# Altium footprint library Res.PcbLib: 49 footprints (part 1 of 4)
Each footprint in its own frame and in the unit in brackets; x right, y up, seen from the top. Pads: shape width x height; smd on the part's side, far side on the other; paste and mask are expansions set on the pad; w line width, h text height; cw(c..) or ccw(c..) is an arc to the next point about the centre after c.
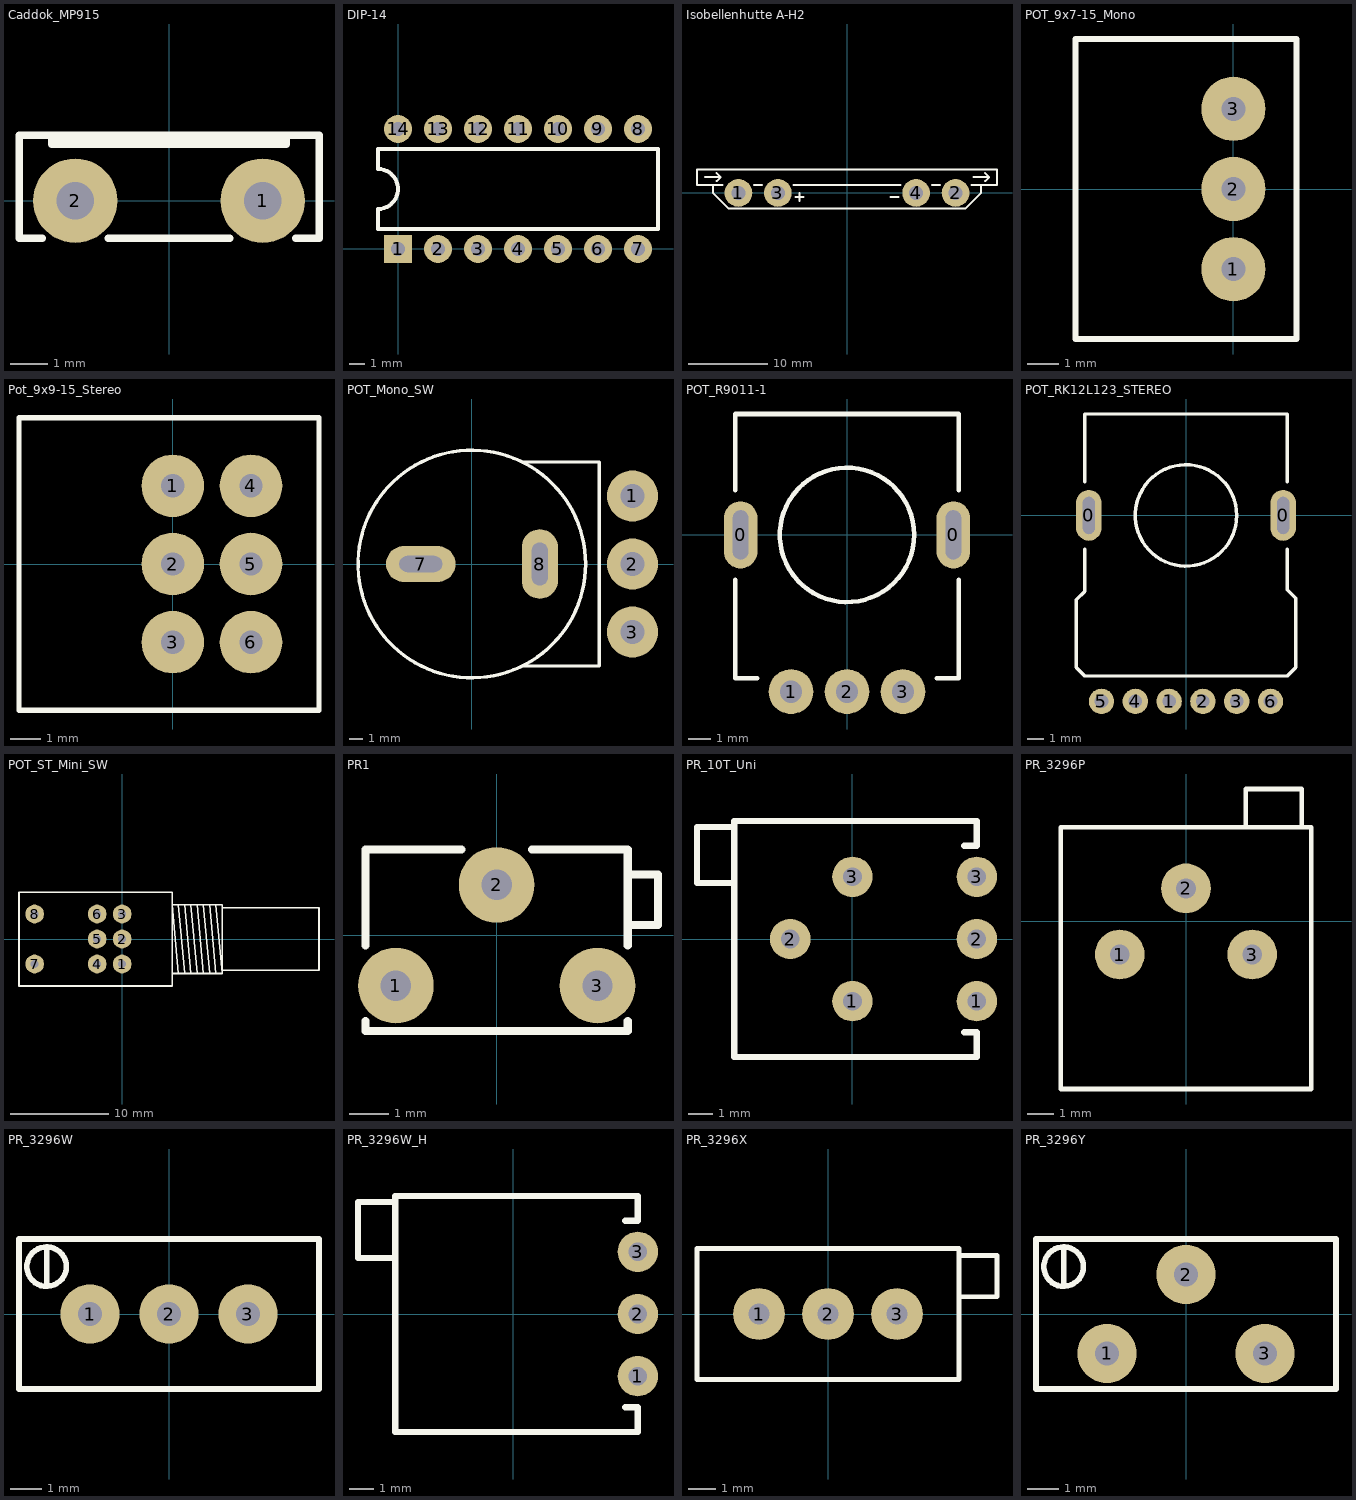
[diagram p0: the footprints below, top view; thin cyan lines are the x and y axes]

## Caddok_MP915 [mil] "Rezystor Caddok TO-126"
height 600
pads (2):
  round 90 hole 40: 1(100,0) 2(-100,0)
Top Overlay:
  rectangle: -125,60 125,70
  lines w8: -135,-40 -160,-40 -160,70 160,70 160,-40 135,-40 ; -125,70 -125,60 125,60 125,70 ; -65,-40 65,-40
3D body "Caddock_MP915_TO-126.STEP": height 559.05, standoff -78.74, extent -159.45,-39.37 159.45,70.87

## DIP-14 [mil] "Dual In-line Package 14 pin THT"
height 200
pads (14):
  rect 70x70 hole 35: 1(0,0)
  round 70 hole 35: 2(100,0) 3(200,0) 4(300,0) 5(400,0) 6(500,0) 7(600,0) 8(600,300) 9(500,300) 10(400,300) 11(300,300) 12(200,300) 13(100,300) 14(0,300)
Top Overlay:
  lines w10: -50,50 -50,100 ccw(c-50,150) -50,200 -50,250 650,250 650,50 -50,50
3D body "DIP_14_RES.STEP": height 154.45, standoff -115.78, extent -77.95,-4.53 677.95,307.28

## Isobellenhutte A-H2 [mm] "A-H2 with standard terminal F1-K2"
height 24.4
pads (4):
  round 3.5 hole 1.8 unplated: 1(-13.75,0) 2(13.75,0) 3(-8.75,0) 4(8.75,0)
Top Overlay:
  lines w0.254: -18,2 -16,2 ; -17,1 -17,0 -15,-2 15,-2 17,0 17,1 ; -16.5,1.5 -16,2 ; -16.5,2.5 -16,2 ; -15.75,1 -19,1 -19,3 19,3 19,1 15.75,1 ; -11.75,1 -10.75,1 ; -6.75,1 6.75,1 ; -6.5,-0.5 -5.5,-0.5 ; -6,-1 -6,0 ; 5.5,-0.5 6.5,-0.5 ; 10.75,1 11.75,1 ; 16,2 18,2 ; 17.5,1.5 18,2 ; 17.5,2.5 18,2

## POT_9x7-15_Mono [mil] "Pot mini 7x9mm oœ 15mm, mono"
height 450
pads (3):
  round 80 hole 30: 1(0,-100) 2(0,0) 3(0,100)
Top Overlay:
  lines w7: -196.85,-187.01 78.74,-187.01 78.74,187.01 -196.85,187.01 -196.85,-187.01
3D body "POT_MINI_Mono.STEP": height 452.76, standoff -96.79, extent -788.55,-187 85.47,187.01

## Pot_9x9-15_Stereo [mil] "Pot 9x9mm, oœ 15mm, stereo"
height 450
pads (6):
  round 80 hole 30: 1(0,100) 2(0,0) 3(0,-100) 4(100,100) 5(100,0) 6(100,-100)
Top Overlay:
  lines w7: -196.85,-187.01 187.01,-187.01 187.01,187.01 -196.85,187.01 -196.85,-187.01
3D body "POT_MINI_Stereo.STEP": height 452.76, standoff -96.79, extent -788.55,-187 187.83,187.01

## POT_Mono_SW [mm] "Potencjometr mono Lin z wy³acznikiem"
height 25.4
pads (5):
  round 3.81 hole 1.8: 1(12,5.08) 2(12,0) 3(12,-5.08)
  oval 5.2x2.7 hole 3.2 slot 1.2 at 90 deg: 7(-3.81,0)
  oval 2.7x5.2 hole 1.2 slot 3.2 at 90 deg: 8(5.08,0)
Top Overlay:
  circle w0.254: c0,0 r8.5
  lines w0.254: 3.81,-7.62 9.525,-7.62 9.525,7.62 3.81,7.62

## POT_R9011-1 [mm] "SR Passives R9011-1; Dim: 10x11 Vertical"
height 25
pads (5):
  oval 1.5x3 hole 2.2 slot 0.7 at 0 deg unplated: 0(-4.75,0) 0(4.75,0)
  round 2 hole 1 unplated: 1(-2.5,-7) 2(0,-7) 3(2.5,-7)
Top Overlay:
  circle w0.203: c0,0 r3
  lines w0.203: -5,-2 -5,-6.4 -4,-6.4 ; -5,2 -5,5.4 0,5.4 5,5.4 5,2 ; 4,-6.4 5,-6.4 5,-2
3D body "R9011-1.SLDPRT": height 24.6, standoff -4.7, extent -5,-7.15 5,5.401

## POT_RK12L123_STEREO [mm] "ALPS RK12L123; Dim: 12x15,5; Vertical"
height 30
pads (8):
  oval 1.5x3 hole 2.2 slot 0.7 at 0 deg unplated: 0(-5.75,0) 0(5.75,0)
  round 1.5 hole 0.8 unplated: 1(-1,-11) 2(1,-11) 3(3,-11) 4(-3,-11) 5(-5,-11) 6(5,-11)
Top Overlay:
  circle w0.203: c0,0 r3
  lines w0.203: -6,-2 -6,-4.5 -6.5,-5 -6.5,-9 -6,-9.5 6,-9.5 6.5,-9 6.5,-4.9 6,-4.4 6,-2 ; -6,2 -6,6 6,6 6,2
3D body "RK12L123.SLDPRT": height 29.9, standoff -3.7, extent -6.5,-11.25 6.5,6.1

## POT_ST_Mini_SW [mil] "Pot, Stereo, Mini, z wy³¹cznikiem"
height 452.76
pads (8):
  round 75 hole 32: 1(0,-100) 2(0,0) 3(0,100) 4(-100,-100) 5(-100,0) 6(-100,100) 7(-350,-100) 8(-350,100)
Top Overlay:
  lines w7: 200,-137.5 400,-137.5 ; 225,-137.5 200,137.5 400,137.5 400,-137.5 ; 225,137.5 250,-137.5 ; 250,137.5 275,-137.5 ; 275,137.5 300,-137.5 ; 300,137.5 325,-137.5 ; 325,137.5 350,-137.5 ; 350,137.5 375,-137.5 ; 375,137.5 400,-137.5 ; 400,-125 787.5,-125 787.5,125 400,125 ; -412.5,-187.5 -412.5,187.5 200,187.5 200,-187.5 -412.5,-187.5
3D body "POT_MINI_Stereo_Switch.STEP": height 452.76, standoff -96.79, extent -412.7,-187.01 790.06,187.01

## PR1 [mil] "Potencjometr monta¿owy"
height 400
pads (3):
  round 75 hole 30: 1(-100,-50) 2(0,50) 3(100,-50)
Top Overlay:
  lines w8: -130,-85 -130,-95 130,-95 130,-85 ; -130,-10 -130,85 -35,85 ; 35,85 130,85 130,-10 ; 130,10 160,10 160,60 130,60
3D body "TRIMMER TEN TURN SIDE ADJUST.STEP": height 250, standoff -188, extent -122.5,-90 162.5,80

## PR_10T_Uni [mil] "PR 10T, uniwersalny"
height 196.85
pads (6):
  round 65 hole 30: 1(0,-100) 1(200,-100) 2(-100,0) 2(200,0) 3(0,100) 3(200,100)
Top Overlay:
  lines w10: -190,90 -250,90 -250,180 -190,180 ; 180,-150 200,-150 200,-190 -190,-190 -190,190 200,190 200,150 180,150
3D body "3296P.STEP": height 190.94, standoff -80.71, extent -250,-187.59 204.72,187.6

## PR_3296P [mil] "PR 10T Bourns horizontal side trimm"
height 200
pads (3):
  round 75 hole 30: 1(-100,-50) 2(0,50) 3(100,-50)
Top Overlay:
  lines w7: 90,142 90,200 175,200 175,142 ; -189,-253 189,-253 189,127 189,142 -189,142 -189,-253
3D body "3296P.STEP": height 189.49, standoff -82.17, extent -187.6,-255 187.6,199.72

## PR_3296W [mil] "PR 10T Bourns top trimm"
height 400
pads (3):
  round 75 hole 30: 1(-100,0) 2(0,0) 3(100,0)
Top Overlay:
  circle w7: c-155,60 r25
  lines w7: -155,35 -155,85 ; -190,-95 -190,95 190,95 190,-95 -190,-95
3D body "3296W.STEP": height 455.72, standoff -61.99, extent -187.6,-94 187.6,94.98

## PR_3296W_H [mil] "PR 3296W - Horizontal"
height 216.54
pads (3):
  round 65 hole 30: 1(200,-100) 2(200,0) 3(200,100)
Top Overlay:
  lines w10: -190,90 -250,90 -250,180 -190,180 ; 180,-150 200,-150 200,-190 -190,-190 -190,190 200,190 200,150 180,150
3D body "3296P.STEP": height 190.94, standoff -80.71, extent -250,-187.59 204.72,187.6

## PR_3296X [mil] "Pot 10T Bourns side trimm"
height 400
pads (3):
  round 75 hole 30: 1(-100,0) 2(0,0) 3(100,0)
Top Overlay:
  lines w7: 190,25 245,25 245,85 190,85 ; -190,-95 -190,95 190,95 190,-95 -190,-95 ; -190,40 -190,40
3D body "3296X.STEP": height 395.88, standoff -61.99, extent -187.6,-94 246.65,94.98

## PR_3296Y [mil] "PR 10T Bourns top trimm"
height 400
pads (3):
  round 75 hole 30: 1(-100,-50) 2(0,50) 3(100,-50)
Top Overlay:
  circle w7: c-155,60 r25
  lines w7: -155,35 -155,85 ; -190,-95 190,-95 190,95 -190,95 -190,-95
3D body "3296Y.STEP": height 455.72, standoff -81.68, extent -187.6,-94 187.6,94.98